# Altium footprint library mylib.PcbLib: 82 footprints (part 5 of 6)
Each footprint in its own frame and in the unit in brackets; x right, y up, seen from the top. Pads: shape width x height; smd on the part's side, far side on the other; paste and mask are expansions set on the pad; w line width, h text height; cw(c..) or ccw(c..) is an arc to the next point about the centre after c.
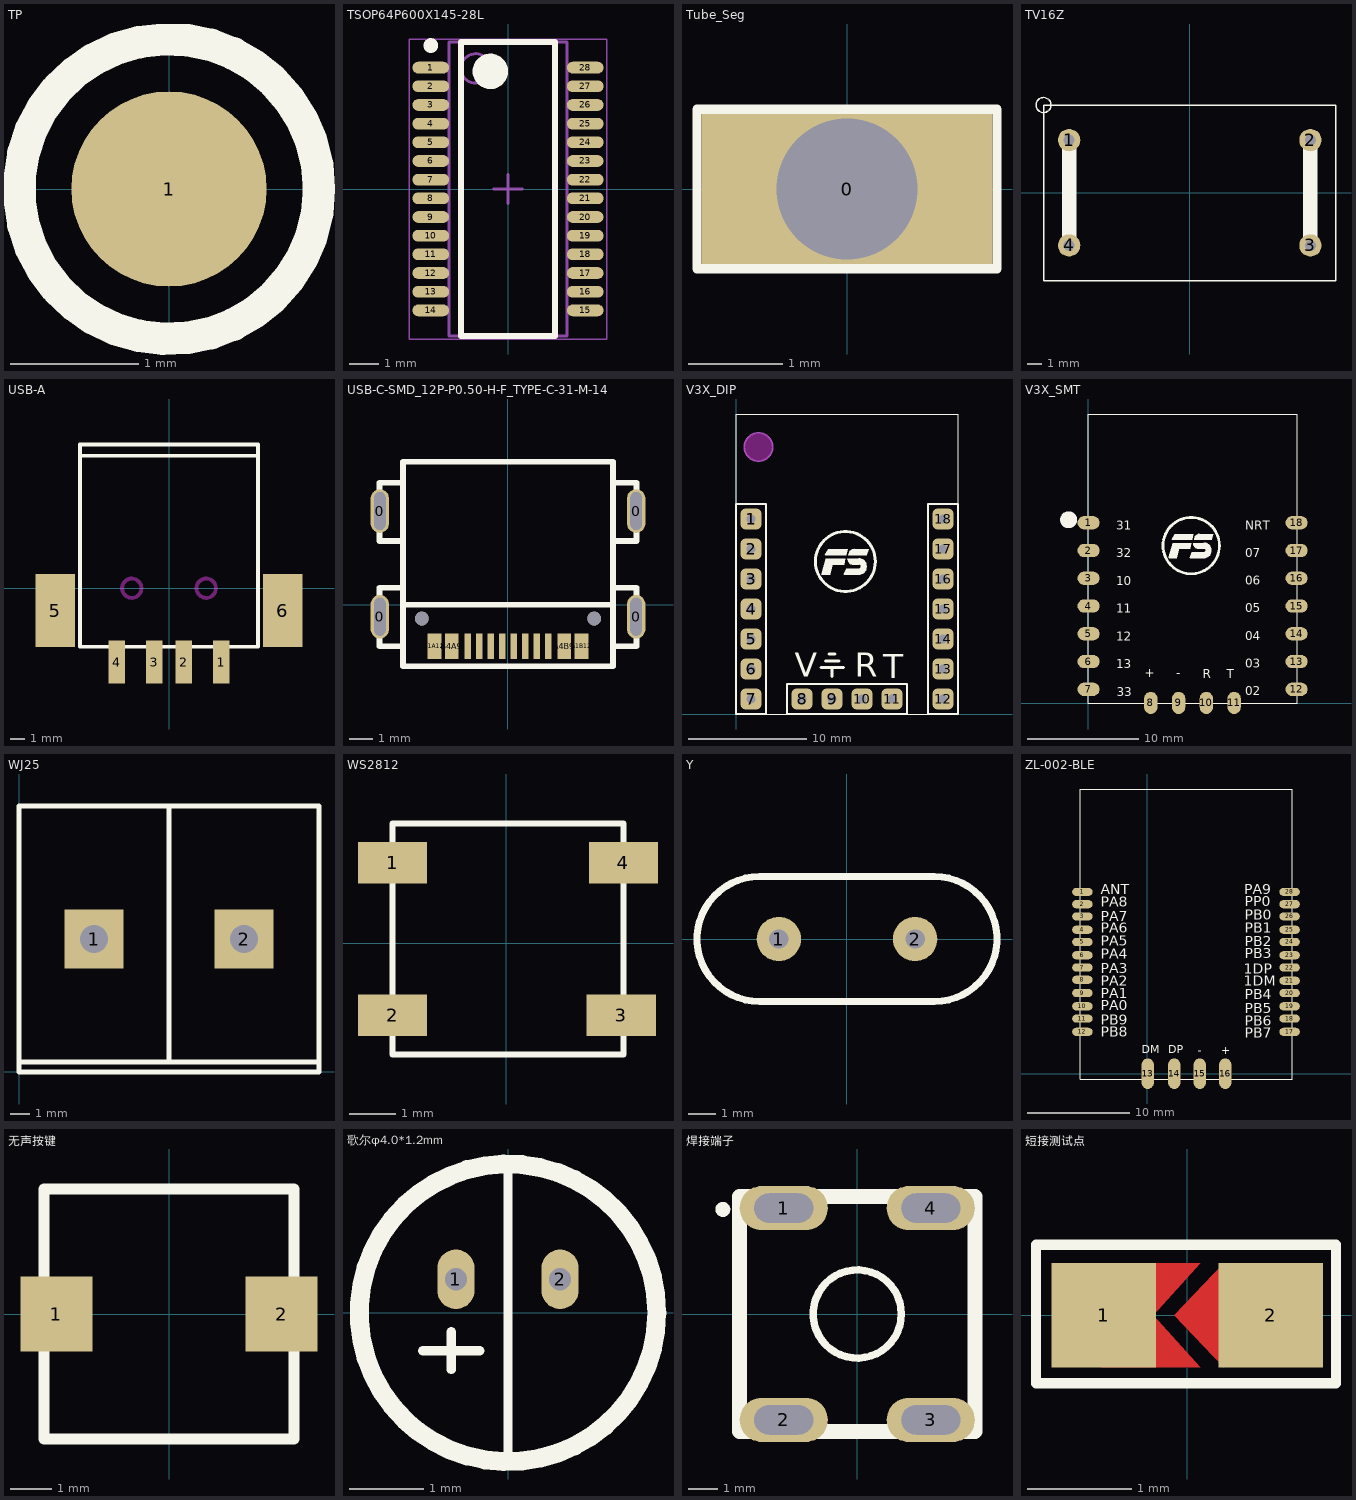
[diagram p4: the footprints below, top view; thin cyan lines are the x and y axes]

## TP [mil]
height 393.7
pads (1):
  round 60 smd mask+11.81: 1(0,0)
Top Overlay:
  circle w10: c0,0 r46.1

## TSOP64P600X145-28L [mm] "TSOP, 28-Leads, Body 9.90x3.90mm, Pitch 0.64mm, IPC High Density"
height 1.45
pads (28):
  oval 1.25x0.4 smd: 1(-2.625,4.127) 2(-2.625,3.492) 3(-2.625,2.857) 4(-2.625,2.222) 5(-2.625,1.587) 6(-2.625,0.953) 7(-2.625,0.318) 8(-2.625,-0.318) 9(-2.625,-0.953) 10(-2.625,-1.587) 11(-2.625,-2.222) 12(-2.625,-2.857) 13(-2.625,-3.492) 14(-2.625,-4.127) 15(2.625,-4.127) 16(2.625,-3.492) 17(2.625,-2.857) 18(2.625,-2.222) 19(2.625,-1.587) 20(2.625,-0.953) 21(2.625,-0.318) 22(2.625,0.318) 23(2.625,0.953) 24(2.625,1.587) 25(2.625,2.222) 26(2.625,2.857) 27(2.625,3.492) 28(2.625,4.127)
Top Overlay:
  circle w0.6: c-0.6,4 r0.3
  circle w0.25: c-2.625,4.878 r0.125
  lines w0.2: -1.6,-5 1.6,-5 1.6,5 -1.6,5 -1.6,-5
Mechanical 13:
  circle w0.1: c-1.1,4.1 r0.5
  lines w0.1: -2,-5 2,-5 2,5 -2,5 -2,-5
Mechanical 15:
  lines w0.05: -3.35,-5.1 3.35,-5.1 3.35,5.1 -3.35,5.1 -3.35,-5.1
  lines w0.1: -0.5,0 0.5,0 ; 0,-0.5 0,0.5
3D body "TSOP64P600X145-28L.step": height 1.45, standoff 0, extent -3,-5 3,5

## Tube_Seg [mm]
pads (1):
  rect 3.1x1.6 hole 1.5 square: 0(0,0)
Top Overlay:
  lines w0.1: -1.6,-0.85 -1.6,0.85 1.6,0.85 1.6,-0.85 -1.6,-0.85

## TV16Z [mil]
pads (4):
  round 60 hole 30: 1(-324.8,141.73) 2(324.8,141.73) 3(324.8,-141.73) 4(-324.8,-141.73)
Top Overlay:
  circle w3.94: c-393.7,236.22 r20.29
  lines w3.94: -393.7,-236.22 393.7,-236.22 393.7,236.22 -393.7,236.22 -393.7,-236.22
  lines w39.37: -324.8,-141.73 -324.8,141.73 ; 324.8,-141.73 324.8,141.73

## USB-A [mm]
pads (6):
  rect 1.12x2.88 smd: 1(3.5,-4.96) 2(1,-4.96) 3(-1,-4.96) 4(-3.5,-4.96)
  rect 2.65x4.9 smd: 5(-7.625,-1.5) 6(7.625,-1.5)
Top Overlay:
  lines w0.254: -5.969,8.89 5.969,8.89 ; -5.969,-3.937 -5.969,9.652 5.969,9.652 5.969,-3.937 -5.969,-3.937
Keep-Out Layer:
  circle w0.254: c2.5,0 r0.65
  circle w0.254: c-2.5,0 r0.65

## USB-C-SMD_12P-P0.50-H-F_TYPE-C-31-M-14 [mm] "Type-C下沉式"
pads (18):
  oval 0.8x1.898 hole 0.5 slot 1.65 at 90 deg: 0(-5.575,-0.517) 0(-5.575,4.083) 0(5.575,-0.517) 0(5.575,4.083)
  rect 0.6x1.1 smd: A1B12(3.2,-1.797) A4B9(2.45,-1.797) B1A12(-3.2,-1.797) B4A9(-2.45,-1.797)
  rect 0.3x1.102 smd: A5(1.249,-1.797) A6(0.251,-1.797) A7(-0.25,-1.797) A8(-1.25,-1.797) B6(-0.75,-1.797) B7(0.751,-1.797) B8(1.749,-1.797)
  rect 0.3x1.1 smd: B5(-1.75,-1.797)
  round 0.6 hole 0.6 unplated: ""(-3.75,-0.597) ""(3.75,-0.597)
Top Overlay:
  lines w0.254: -4.572,-1.797 -5.588,-1.797 -5.588,0.743 -4.572,0.743 ; -4.572,-0.045 -4.572,6.223 4.572,6.223 4.572,-0.045 ; -4.572,0.006 4.572,0.006 ; -4.572,0.133 -4.572,-2.667 4.572,-2.667 4.572,0.133 ; -4.572,2.775 -5.588,2.775 -5.588,5.315 -4.572,5.315 ; 4.572,-1.797 5.588,-1.797 5.588,0.743 4.572,0.743 ; 4.572,2.775 5.588,2.775 5.588,5.315 4.572,5.315

## V3X_DIP [mil]
pads (18):
  rrect50% 70x70 hole 31.5: 1(50,650) 2(50,550) 3(50,450) 4(50,350) 5(50,250) 6(50,150) 7(50,50) 8(220,50) 9(320,50) 10(420,50) 11(520,50) 12(690,50) 13(690,150) 14(690,250) 15(690,350) 16(690,450) 17(690,550) 18(690,650)
Top Overlay:
  circle w10: c364.65,508.46 r100
  region: 436.65,530.46 442.65,548.46 392.65,548.46 389.26,548.46 383.02,545.88 378.23,541.09 375.65,534.85 375.65,531.46 375.65,530.46
  region: 372.65,516.46 372.65,513.08 375.23,506.83 380.02,502.05 386.26,499.46 389.65,499.46 412.65,499.46 413.82,499.35 415.98,498.45 417.63,496.8 418.53,494.64 418.65,493.46 418.65,492.46 418.49,490.9 417.3,488.02 415.09,485.81 412.21,484.62 410.65,484.46 368.65,484.46 361.65,465.46 412.65,465.46 417.02,465.46 425.11,468.81 431.3,475 434.65,483.09 434.65,487.46 434.65,496.46 434.65,500.44 431.6,507.79 425.97,513.42 418.62,516.46 414.65,516.46
  region: 300.65,517.46 364.65,517.46 360.65,499.46 322.65,499.46 313.65,465.46 286.65,465.46
  region: 308.65,548.46 372.65,548.46 367.65,530.46 297.65,530.46
  lines w3.94: 0,0 740,0 740,1000 0,1000 0,0
  lines w4: 287.65,468.46 300.65,517.46 364.65,517.46 360.65,499.46 322.65,499.46 313.65,465.46 286.65,465.46 288.65,472.46 ; 374.65,530.46 436.65,530.46 442.65,548.46 392.65,548.46 397.65,548.46 ; 374.74,530.45 cw(c394.65,528.46) 393.65,548.44 ; 297.65,530.46 367.65,530.46 372.65,548.46 308.65,548.46 297.65,530.46 ; 360.65,465.46 409.65,465.46 ccw(c409.65,491.46) 409.65,517.46 371.65,517.46 ccw(c389.65,517.46) 389.65,499.46 410.65,499.46 cw(c410.65,491.96) 410.65,484.46 368.65,484.46 360.65,465.46
  lines w7.87: 0,0 0,700 100,700 100,0 0,0 ; 170,0 170,100 570,100 570,0 170,0 ; 640,0 640,700 740,700 740,0 640,0
  lines w10: 282.5,155 357.5,155 ; 297.5,177.5 342.5,177.5 ; 310,200 330,200 ; 320,125 320,155
  text "V" at 195,125 h80
  text "R" at 395,125 h80
  text "T" at 490,120 h80
Bottom Overlay:
  text "02" at 640,30 h39.37
  text "03" at 640,129.17 h39.37
  text "04" at 640,228.33 h39.37
  text "05" at 640,327.5 h39.37
  text "06" at 640,426.67 h39.37
  text "07" at 640,525.83 h39.37
  text "NRT" at 640,625 h39.37
  text "33" at 165,30 h39.37
  text "11" at 165,332.5 h39.37
  text "10" at 165,433.33 h39.37
  text "13" at 165,130.83 h39.37
  text "12" at 165,231.67 h39.37
  text "32" at 165,534.17 h39.37
  text "31" at 165,635 h39.37
Top Solder:
  text "FS-BLE-V3X" at 15,735 h39.37
Keep-Out Layer:
  board cut-out: 75,842.76 70.35,842.76 61.22,844.57 52.62,848.13 44.88,853.3 38.3,859.88 33.13,867.62 29.57,876.22 27.76,885.35 27.76,890 27.76,894.65 29.57,903.78 33.13,912.38 38.3,920.12 44.88,926.7 52.62,931.87 61.22,935.43 70.35,937.24 75,937.24 79.65,937.24 88.78,935.43 97.38,931.87 105.12,926.7 111.7,920.12 116.87,912.38 120.43,903.78 122.24,894.65 122.24,890 122.24,885.35 120.43,876.22 116.87,867.62 111.7,859.88 105.12,853.3 97.38,848.13 88.78,844.57 79.65,842.76
Mechanical 1:
  circle w6: c75,890 r47.24

## V3X_SMT [mm]
pads (18):
  oval 2x1.2 smd: 1(0.024,16.245) 2(0.024,13.745) 3(0.024,11.245) 4(0.024,8.745) 5(0.024,6.245) 6(0.024,3.745) 7(0.024,1.245) 12(18.747,1.245) 13(18.747,3.745) 14(18.747,6.245) 15(18.747,8.745) 16(18.747,11.245) 17(18.747,13.745) 18(18.747,16.245)
  oval 1.2x2 smd: 8(5.628,0.024) 9(8.128,0.024) 10(10.628,0.024) 11(13.128,0.024)
Top Overlay:
  circle w0.762: c-1.778,16.51 r0.381
  circle w0.254: c9.262,14.185 r2.54
  region: 7.636,14.414 9.262,14.414 9.16,13.956 8.195,13.956 7.967,13.093 7.281,13.093
  region: 9.465,14.388 9.465,14.302 9.531,14.144 9.652,14.022 9.811,13.956 9.897,13.956 10.481,13.956 10.511,13.953 10.566,13.931 10.608,13.889 10.631,13.834 10.634,13.804 10.634,13.779 10.63,13.739 10.599,13.666 10.543,13.61 10.47,13.579 10.43,13.575 9.364,13.575 9.186,13.093 10.481,13.093 10.592,13.093 10.798,13.178 10.955,13.335 11.04,13.54 11.04,13.652 11.04,13.88 11.04,13.981 10.963,14.168 10.82,14.311 10.633,14.388 10.532,14.388
  region: 11.091,14.744 11.243,15.201 9.973,15.201 9.887,15.201 9.729,15.135 9.607,15.014 9.541,14.855 9.541,14.769 9.541,14.744
  region: 7.84,15.201 9.465,15.201 9.338,14.744 7.56,14.744
  lines w0.1: 0,0 0,26.035 18.796,26.035 18.796,0 0,0
  lines w0.102: 7.306,13.169 7.636,14.414 9.262,14.414 9.16,13.956 8.195,13.956 7.967,13.093 7.281,13.093 7.332,13.271 ; 9.516,14.744 11.091,14.744 11.243,15.201 9.973,15.201 10.1,15.201 ; 9.519,14.744 cw(c10.024,14.693) 9.999,15.2 ; 7.56,14.744 7.84,15.201 9.465,15.201 9.338,14.744 7.56,14.744 ; 9.16,13.093 10.405,13.093 ccw(c10.405,13.753) 10.405,14.414 9.44,14.414 ccw(c9.897,14.414) 9.897,13.956 10.43,13.956 cw(c10.43,13.766) 10.43,13.575 9.364,13.575 9.16,13.093
  text "05" at 14.11,8.166 h0.8
  text "06" at 14.11,10.651 h0.8
  text "07" at 14.11,13.136 h0.8
  text "02" at 14.11,0.711 h0.8
  text "04" at 14.11,5.681 h0.8
  text "NRT" at 14.11,15.621 h0.8
  text "03" at 14.11,3.196 h0.8
  text "32" at 2.509,13.123 h0.8
  text "10" at 2.509,10.626 h0.8
  text "11" at 2.509,8.128 h0.8
  text "13" at 2.509,3.133 h0.8
  text "33" at 2.54,0.635 h0.8
  text "12" at 2.509,5.63 h0.8
  text "T" at 12.471,2.235 h0.8
  text "R" at 10.312,2.235 h0.8
  text "-" at 7.899,2.311 h0.8
  text "+" at 5.08,2.311 h0.8
  text "31" at 2.509,15.621 h0.8
3D body: height 0.25, standoff 0, extent 0,0 18.796,26
3D body: height 0.51, standoff 0.25, extent 0,0 18.796,18.542

## WJ25 [mm]
height 14.8
pads (2):
  rect 3x3 hole 1.4: 1(3.81,6.75) 2(11.43,6.75)
Top Overlay:
  lines w0.254: 0,0.508 15.24,0.508 ; 7.62,0.508 7.62,13.5 ; 0,0 0,13.5 15.24,13.5 15.24,0 0,0

## WS2812 [mm]
pads (4):
  rect 1.5x0.9 smd: 1(-2.46,1.737) 2(-2.46,-1.563) 3(2.493,-1.563) 4(2.54,1.737)
Top Overlay:
  lines w0.127: -2.46,-2.413 2.54,-2.413 2.54,2.587 -2.46,2.587 -2.46,-2.413

## Y [mm]
pads (2):
  round 1.6 hole 0.7: 1(-2.45,0) 2(2.45,0)
Top Overlay:
  lines w0.254: -3.15,-2.248 cw(c-3.15,0) -3.15,2.248 3.15,2.248 cw(c3.15,0) 3.15,-2.248 -3.15,-2.248
3D body "hc-49s_n.stp": height 3.6, standoff -2.9, extent -5.388,-2.27 5.412,2.23

## ZL-002-BLE [mm]
pads (28):
  oval 2x0.8 smd: 1(-6.343,17.802) 2(-6.343,16.602) 3(-6.343,15.402) 4(-6.343,14.102) 5(-6.343,12.902) 6(-6.343,11.602) 7(-6.343,10.402) 8(-6.343,9.202) 9(-6.343,7.902) 10(-6.343,6.602) 11(-6.343,5.402) 12(-6.343,4.102) 17(13.957,4.102) 18(13.957,5.402) 19(13.957,6.602) 20(13.957,7.902) 21(13.957,9.102) 22(13.957,10.402) 23(13.957,11.602) 24(13.957,12.902) 25(13.957,14.102) 26(13.957,15.402) 27(13.957,16.602) 28(13.957,17.802)
  oval 1.2x3 smd: 13(0.057,0.002) 14(2.657,0.002) 15(5.157,0.002) 16(7.657,0.002)
Top Overlay:
  lines w0.1: -6.55,-0.563 -6.55,27.885 14.207,27.885 14.207,-0.563 -6.55,-0.563
  text "+" at 7.257,1.902 h0.8
  text "-" at 4.957,1.902 h0.8
  text "DP" at 2.057,2.002 h0.8
  text "DM" at -0.543,2.002 h0.8
  text "PB7" at 9.557,3.502 h1
  text "PB6" at 9.557,4.702 h1
  text "PB5" at 9.557,5.902 h1
  text "PB4" at 9.557,7.302 h1
  text "1DM" at 9.457,8.602 h1
  text "1DP" at 9.457,9.802 h1
  text "PB3" at 9.557,11.302 h1
  text "PB2" at 9.557,12.502 h1
  text "PB1" at 9.557,13.802 h1
  text "PB0" at 9.557,15.102 h1
  text "PP0" at 9.557,16.402 h1
  text "PA9" at 9.522,17.598 h1
  text "PB9" at -4.543,4.802 h1
  text "PA0" at -4.543,6.202 h1
  text "PA1" at -4.543,7.402 h1
  text "PA2" at -4.543,8.602 h1
  text "PA3" at -4.535,9.851 h1
  text "PA4" at -4.535,11.248 h1
  text "PA5" at -4.535,12.518 h1
  text "PA6" at -4.535,13.788 h1
  text "PA7" at -4.535,14.931 h1
  text "PA8" at -4.535,16.328 h1
  text "ANT" at -4.535,17.598 h1
  text "PB8" at -4.543,3.602 h1

## 无声按键 [mm] "6*6*5无声按键"
pads (2):
  rect 1.725x1.8 smd: 1(-2.7,0) 2(2.7,0)
Top Overlay:
  lines w0.254: -3,-3 3,-3 3,3 -3,3 -3,-3
3D body: height 5, standoff 0, extent -3.048,-2.984 3.048,2.984

## 歌尔φ4.0*1.2mm [mm]
pads (2):
  oval 0.5x0.8 hole 0.3: 1(-0.7,0.45) 2(0.7,0.45)
Top Overlay:
  circle w0.254: c0,0 r2
  lines w0.127: -1.143,-0.508 -0.381,-0.508 ; -0.762,-0.762 -0.762,-0.254 ; 0,-2.032 0,1.905
3D body: height 2.3, standoff 0.3, extent -2,-2 2,2

## 焊接端子 [mm] "PCB焊接端子"
pads (4):
  oval 3x1.5 hole 1 slot 2 at 0 deg: 1(-2.5,3.6) 2(-2.5,-3.6) 3(2.5,-3.6) 4(2.5,3.6)
Top Overlay:
  circle w0.254: c-4.572,3.556 r0.127
  circle w0.254: c0,0 r1.5
  lines w0.508: -4,-4 -4,4 4,4 4,-4 -4,-4

## 短接测试点 [mm]
pads (2):
  rect 1x1 smd: 1(-0.8,0) 2(0.8,0)
Top Layer:
  region: 0.35,0.5 -0.123,0 0.35,-0.5
  region: -0.825,0.5 0.125,0.5 -0.325,0 0.125,-0.5 -0.825,-0.5
Top Overlay:
  lines w0.1: -1.45,-0.65 -1.45,0.675 1.425,0.675 1.425,-0.65 -1.45,-0.65
Top Solder:
  region: -0.475,0.5 0.125,0.5 -0.325,0 0.125,-0.5 -0.475,-0.5
  region: 0.35,0.5 -0.125,0 0.35,-0.5